# Altium footprint library rcl_PTH.PCBLIB: 344 footprints (part 13 of 22)
Each footprint in its own frame and in the unit in brackets; x right, y up, seen from the top. Pads: shape width x height; smd on the part's side, far side on the other; paste and mask are expansions set on the pad; w line width, h text height; cw(c..) or ccw(c..) is an arc to the next point about the centre after c.
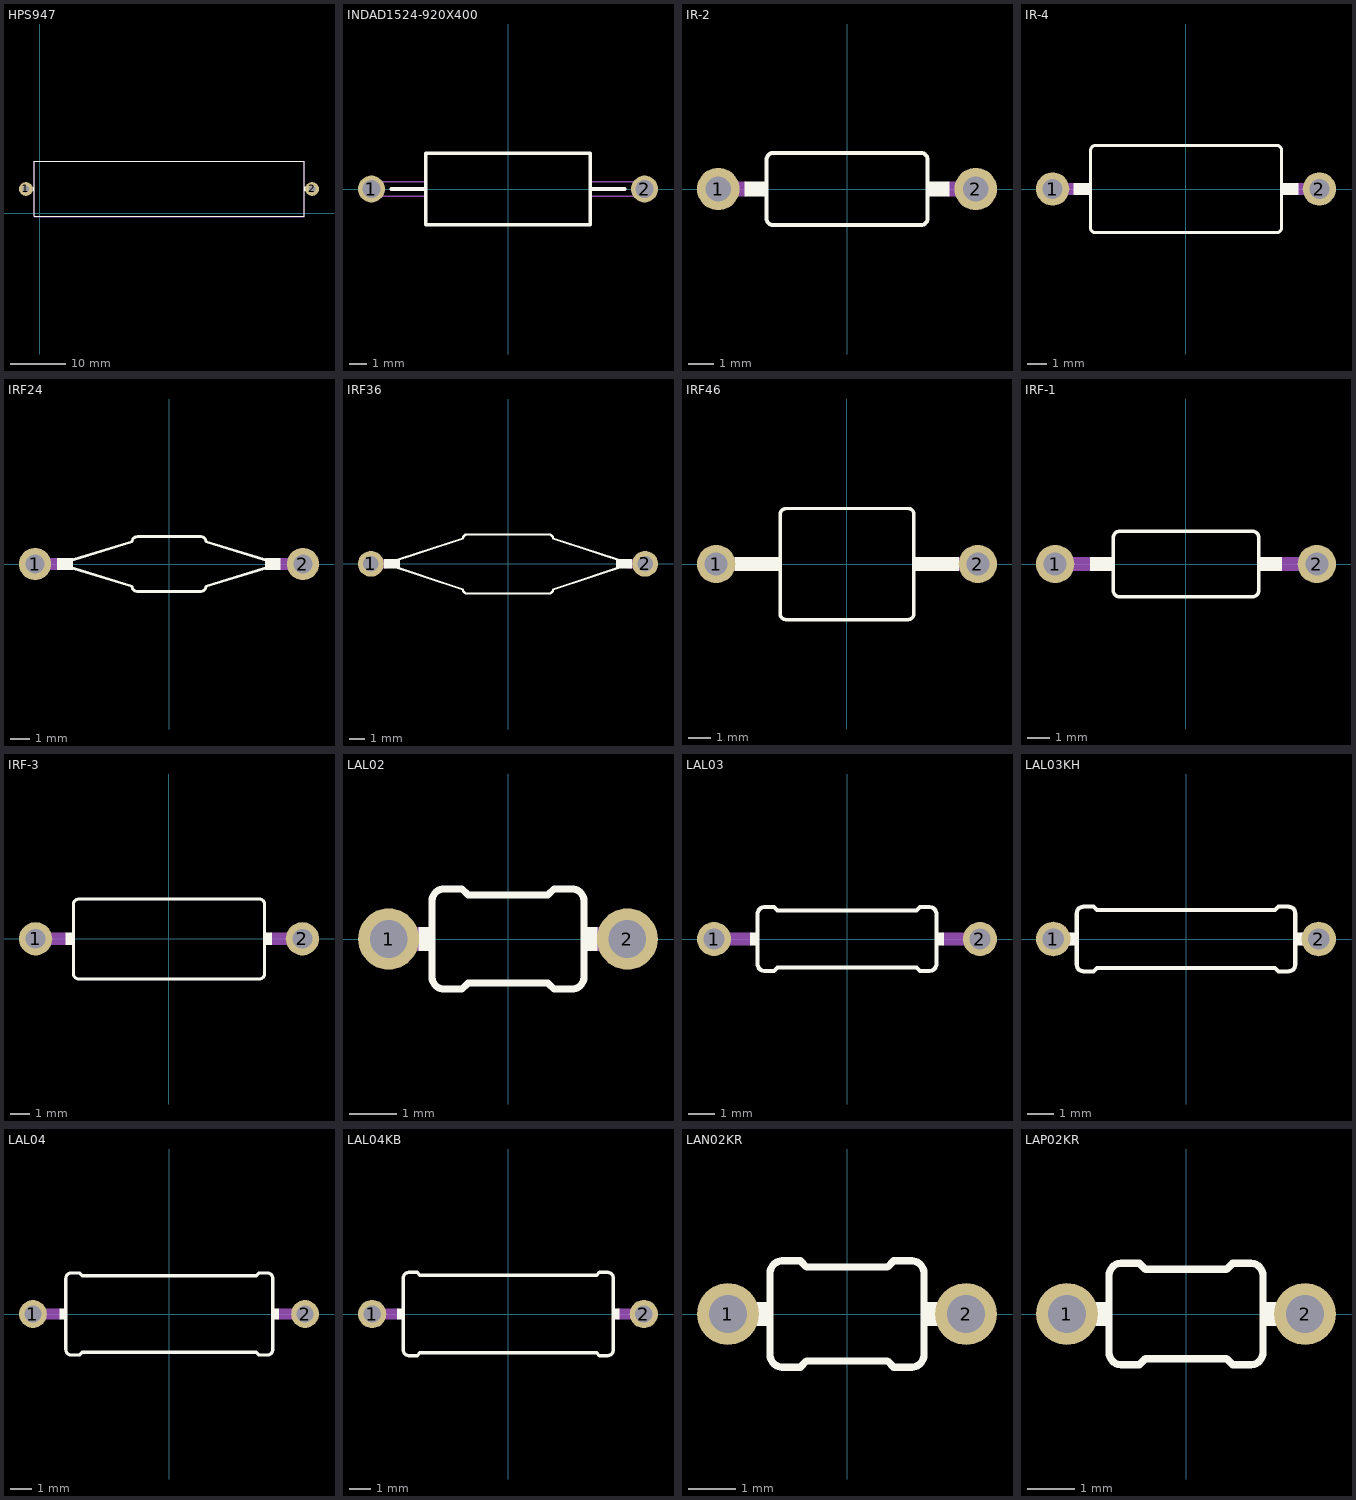
[diagram p12: the footprints below, top view; thin cyan lines are the x and y axes]

## HPS947 [mm]
pads (2):
  round 2.5 hole 1.2: 1(-2.54,4.425) 2(49.4,4.425)
Top Overlay:
  rectangle: -1.346,4.025 -1.067,4.825
  rectangle: 48.006,4.077 48.285,4.877
  lines w0.152: -1.067,-0.559 47.93,-0.559 47.93,9.423 -1.067,9.423 -1.067,-0.559
Mechanical 1:
  lines w0.127: -1.067,-0.577 47.933,-0.577 47.933,9.423 -1.067,9.423 -1.067,-0.577
3D body: height 9.6, standoff 0.4, extent -1.067,-0.33 47.93,9.423

## INDAD1524-920X400 [mm] "Inductor, Axial Diameter, Pad spacing 15.24 mm - Body Lengh 9.2mm X Body Diameter 4mm"
height 4
pads (2):
  round 1.5 hole 1: 1(-7.62,0) 2(7.62,0)
Top Overlay:
  lines w0.2: -6.5,0 -4.6,0 ; 4.6,0 6.5,0 ; -4.6,-2 -4.6,2 4.6,2 4.6,-2 -4.6,-2
Mechanical 14:
  lines w0.1: -7.62,-0.4 -7.62,0.4 -4.6,0.4 -4.6,-0.4 -7.62,-0.4 ; -4.6,-2 -4.6,2 4.6,2 4.6,-2 -4.6,-2 ; 4.6,-0.4 7.62,-0.4 7.62,0.4 4.6,0.4 4.6,-0.4
3D body "INDAD1524-920X400.stp": height 4, standoff -3.6, extent -8.02,-2 8.02,2

## IR-2 [mil]
pads (2):
  round 66 hole 39.37: 1(-200,0) 2(200,0)
Top Overlay:
  rectangle: 125,-12 159,12
  rectangle: -159,-12 -125,12
  lines w6: -125,-45.83 ccw(c-114.94,-46.05) -115.16,-56.1 115.16,-56.1 ccw(c114.94,-46.05) 125,-45.83 125,45.83 ccw(c114.94,46.05) 115.16,56.1 -114.17,56.1 ccw(c-114.45,45.55) -125,45.83 -125,-45.83
Mechanical 16:
  lines w24: -200,0 -160,0 ; 160,0 200,0

## IR-4 [mil]
pads (2):
  round 66 hole 39.37: 1(-263.98,0) 2(264.96,0)
Top Overlay:
  rectangle: -222.98,-12 -188.98,12
  rectangle: 189.96,-12 223.96,12
  lines w6: -188.98,-76.34 ccw(c-178.92,-76.55) -179.13,-86.61 180.12,-86.61 ccw(c179.91,-76.56) 189.96,-76.34 189.96,76.34 ccw(c179.91,76.56) 180.12,86.61 -178.15,86.61 ccw(c-178.43,76.06) -188.98,76.34 -188.98,-76.34
Mechanical 16:
  lines w24: -263.98,0 -223.98,0 ; 224.96,0 264.96,0

## IRF24 [mil]
pads (2):
  round 66 hole 39.37: 1(-275,0) 2(275,0)
Top Overlay:
  rectangle: -230.32,-12 -196.85,12
  rectangle: 196.85,-12 229.33,12
  lines w6: -225.39,0 -75.79,45.83 cw(c-65.24,45.55) -64.96,56.1 65.94,56.1 cw(c65.73,46.04) 75.79,45.83 225.39,0 75.79,-45.83 cw(c65.73,-46.04) 65.94,-56.1 -65.94,-56.1 cw(c-65.73,-46.04) -75.79,-45.83 -225.39,0
Mechanical 16:
  lines w24: -275,0 -232.87,0 ; 229.33,0 275,0

## IRF36 [mil]
pads (2):
  round 66 hole 39.37: 1(-350,0) 2(350,0)
Top Overlay:
  rectangle: -316.93,-12 -275.59,12
  rectangle: 275.59,-12 316.93,12
  lines w6: -312.99,0 -115.16,64.53 cw(c-104.61,64.25) -104.33,74.8 105.32,74.8 cw(c105.11,64.75) 115.16,64.53 312.99,0 115.16,-65.51 cw(c105.1,-65.73) 105.32,-75.79 -105.32,-75.79 cw(c-105.1,-65.73) -115.16,-65.51 -312.99,0
Mechanical 16:
  lines w24: -350,0 -311.61,0 ; 308.07,0 350,0

## IRF46 [mil]
pads (2):
  round 66 hole 39.37: 1(-225,0) 2(225,0)
Top Overlay:
  rectangle: -193.9,-12 -115.16,12
  rectangle: 115.16,-12 192.91,12
  lines w6: -115.16,-85.2 ccw(c-105.11,-85.42) -105.32,-95.47 105.32,-95.47 ccw(c105.11,-85.42) 115.16,-85.2 115.16,85.2 ccw(c105.11,85.42) 105.32,95.47 -104.33,95.47 ccw(c-104.61,84.92) -115.16,85.2 -115.16,-85.2
Mechanical 16:
  lines w24: -225,0 -175,0 ; 175,0 225,0

## IRF-1 [mil]
pads (2):
  round 66 hole 39.37: 1(-225,0) 2(225,0)
Top Overlay:
  rectangle: -165.35,-12 -125,12
  rectangle: 125,-12 165.35,12
  lines w6: -125,-45.83 ccw(c-114.94,-46.05) -115.16,-56.1 115.16,-56.1 ccw(c114.94,-46.05) 125,-45.83 125,45.83 ccw(c114.94,46.05) 115.16,56.1 -114.17,56.1 ccw(c-114.45,45.55) -125,45.83 -125,-45.83
Mechanical 16:
  lines w24: -225,0 -160,0 ; 160,0 225,0

## IRF-3 [mil]
pads (2):
  round 66 hole 39.37: 1(-263.98,0) 2(264.96,0)
Top Overlay:
  rectangle: -204.72,-12 -188.98,12
  rectangle: 189.96,-12 204.72,12
  lines w6: -188.98,-69.45 ccw(c-178.92,-69.66) -179.13,-79.72 180.12,-79.72 ccw(c179.91,-69.67) 189.96,-69.45 189.96,68.46 ccw(c179.9,68.68) 180.12,78.74 -178.15,78.74 ccw(c-178.43,68.19) -188.98,68.46 -188.98,-69.45
Mechanical 16:
  lines w24: -263.98,0 -205.71,0 ; 204.72,0 264.96,0

## LAL02 [mil]
pads (2):
  round 51.18 hole 31.5: 1(-100,0) 2(100,0)
Top Overlay:
  rectangle: -74.8,-10 -63.58,10
  rectangle: 63.58,-10 74.8,10
  lines w6: -63.58,-31.97 ccw(c-53.58,-31.97) -53.58,-41.97 -38.58,-41.97 -33.58,-36.97 33.58,-36.97 38.58,-41.97 53.58,-41.97 ccw(c53.58,-31.97) 63.58,-31.97 63.58,31.97 ccw(c53.58,31.97) 53.58,41.97 38.58,41.97 33.58,36.97 -33.58,36.97 -38.58,41.97 -53.58,41.97 ccw(c-53.58,31.97) -63.58,31.97 -63.58,-31.97
Mechanical 16:
  lines w20: -100,0 -75,0 ; 75,0 100,0

## LAL03 [mil]
pads (2):
  round 51.18 hole 31.5: 1(-200,0) 2(200,0)
Top Overlay:
  rectangle: -145.67,-10 -134.45,10
  rectangle: 134.45,-10 145.67,10
  lines w6: -134.45,-37.87 ccw(c-124.45,-37.87) -124.45,-47.87 -109.45,-47.87 -104.45,-42.87 104.45,-42.87 109.45,-47.87 124.45,-47.87 ccw(c124.45,-37.87) 134.45,-37.87 134.45,37.87 ccw(c124.45,37.87) 124.45,47.87 109.45,47.87 104.45,42.87 -104.45,42.87 -109.45,47.87 -124.45,47.87 ccw(c-124.45,37.87) -134.45,37.87 -134.45,-37.87
Mechanical 16:
  lines w20: -200,0 -145.87,0 ; 145.87,0 200,0

## LAL03KH [mil]
pads (2):
  round 51.18 hole 31.5: 1(-196.85,0) 2(196.85,0)
Top Overlay:
  rectangle: -173.23,-10 -162.01,10
  rectangle: 162.01,-10 173.23,10
  lines w6: -162.01,-37.87 ccw(c-152.01,-37.87) -152.01,-47.87 -137.01,-47.87 -132.01,-42.87 132.01,-42.87 137.01,-47.87 152.01,-47.87 ccw(c152.01,-37.87) 162.01,-37.87 162.01,37.87 ccw(c152.01,37.87) 152.01,47.87 137.01,47.87 132.01,42.87 -132.01,42.87 -137.01,47.87 -152.01,47.87 ccw(c-152.01,37.87) -162.01,37.87 -162.01,-37.87
Mechanical 16:
  lines w20: -196.85,0 -173.43,0 ; 173.43,0 196.85,0

## LAL04 [mil]
pads (2):
  round 51.18 hole 31.5: 1(-250,0) 2(250,0)
Top Overlay:
  rectangle: -200.79,-10 -189.57,10
  rectangle: 190.55,-10 201.77,10
  lines w6: -189.57,-65.43 ccw(c-179.57,-65.43) -179.57,-75.43 -164.57,-75.43 -159.57,-70.43 160.55,-70.43 165.55,-75.43 180.55,-75.43 ccw(c180.55,-65.43) 190.55,-65.43 190.55,65.43 ccw(c180.55,65.43) 180.55,75.43 165.55,75.43 160.55,70.43 -159.57,70.43 -164.57,75.43 -179.57,75.43 ccw(c-179.57,65.43) -189.57,65.43 -189.57,-65.43
Mechanical 16:
  lines w20: -250,0 -200.98,0 ; 201.97,0 250,0

## LAL04KB [mil]
pads (2):
  round 51.18 hole 31.5: 1(-246.06,0) 2(246.06,0)
Top Overlay:
  rectangle: -200.79,-10 -189.57,10
  rectangle: 190.55,-10 201.77,10
  lines w6: -189.57,-65.43 ccw(c-179.57,-65.43) -179.57,-75.43 -164.57,-75.43 -159.57,-70.43 160.55,-70.43 165.55,-75.43 180.55,-75.43 ccw(c180.55,-65.43) 190.55,-65.43 190.55,65.43 ccw(c180.55,65.43) 180.55,75.43 165.55,75.43 160.55,70.43 -159.57,70.43 -164.57,75.43 -179.57,75.43 ccw(c-179.57,65.43) -189.57,65.43 -189.57,-65.43
Mechanical 16:
  lines w20: -246.06,0 -200.98,0 ; 201.97,0 246.06,0

## LAN02KR [mil]
pads (2):
  round 51.18 hole 31.5: 1(-98.43,0) 2(98.43,0)
Top Overlay:
  rectangle: 63.58,-10 74.8,10
  rectangle: -74.8,-10 -63.58,10
  lines w6: -63.58,-33.94 ccw(c-53.58,-33.94) -53.58,-43.94 -38.58,-43.94 -33.58,-38.94 33.58,-38.94 38.58,-43.94 53.58,-43.94 ccw(c53.58,-33.94) 63.58,-33.94 63.58,33.94 ccw(c53.58,33.94) 53.58,43.94 38.58,43.94 33.58,38.94 -33.58,38.94 -38.58,43.94 -53.58,43.94 ccw(c-53.58,33.94) -63.58,33.94 -63.58,-33.94
Mechanical 16:
  lines w20: -98.43,0 -75,0 ; 75,0 98.43,0

## LAP02KR [mil]
pads (2):
  round 51.18 hole 31.5: 1(-98.43,0) 2(98.43,0)
Top Overlay:
  rectangle: 63.58,-10 74.8,10
  rectangle: -74.8,-10 -63.58,10
  lines w6: -63.58,-31.97 ccw(c-53.58,-31.97) -53.58,-41.97 -38.58,-41.97 -33.58,-36.97 33.58,-36.97 38.58,-41.97 53.58,-41.97 ccw(c53.58,-31.97) 63.58,-31.97 63.58,31.97 ccw(c53.58,31.97) 53.58,41.97 38.58,41.97 33.58,36.97 -33.58,36.97 -38.58,41.97 -53.58,41.97 ccw(c-53.58,31.97) -63.58,31.97 -63.58,-31.97
Mechanical 16:
  lines w20: -98.43,0 -75,0 ; 75,0 98.43,0